# Altium footprint library ICs And Semiconductors SMD.PcbLib: 943 footprints (part 43 of 60)
Each footprint in its own frame and in the unit in brackets; x right, y up, seen from the top. Pads: shape width x height; smd on the part's side, far side on the other; paste and mask are expansions set on the pad; w line width, h text height; cw(c..) or ccw(c..) is an arc to the next point about the centre after c.
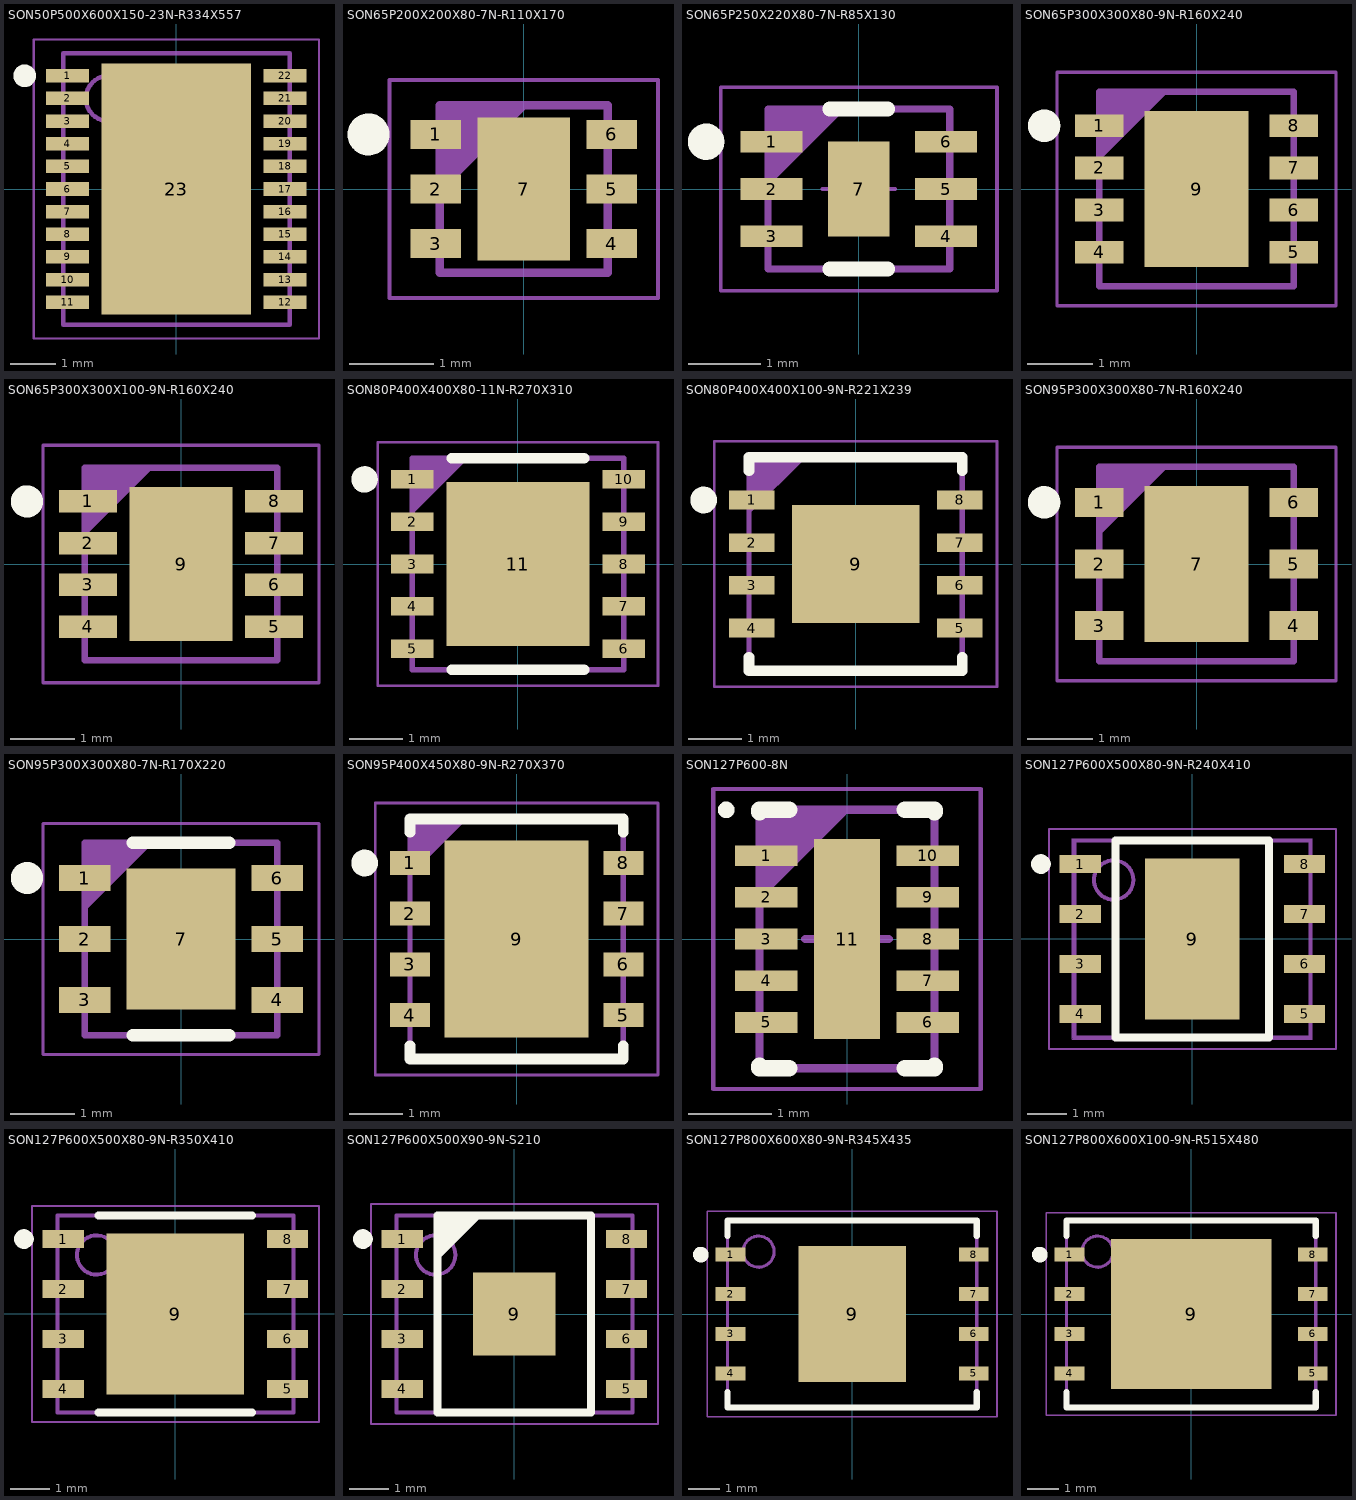
[diagram p42: the footprints below, top view; thin cyan lines are the x and y axes]

## SON50P500X600X150-23N-R334X557 [mm] "SON, 0.50mm Pitch; 22 Pin, 5.00mm W X 6.00mm L X 1.50mm H Body (w/Thermal Tab 3.34 X 5.57mm), IPC Medium Density"
height 1.5
pads (23):
  rect 0.95x0.3 smd: 1(-2.4,2.5) 2(-2.4,2) 3(-2.4,1.5) 4(-2.4,1) 5(-2.4,0.5) 6(-2.4,0) 7(-2.4,-0.5) 8(-2.4,-1) 9(-2.4,-1.5) 10(-2.4,-2) 11(-2.4,-2.5) 12(2.4,-2.5) 13(2.4,-2) 14(2.4,-1.5) 15(2.4,-1) 16(2.4,-0.5) 17(2.4,0) 18(2.4,0.5) 19(2.4,1) 20(2.4,1.5) 21(2.4,2) 22(2.4,2.5)
  rect 3.3x5.55 smd: 23(0,0)
Top Overlay:
  circle w0.25: c-3.35,2.5 r0.125
Top Paste:
  region: -0.9,-2.27 0.9,-2.27 0.9,-0.25 -0.9,-0.25
  region: -0.9,0.25 0.9,0.25 0.9,2.27 -0.9,2.27
Top Solder:
  circle w0.05: c0,0 r0.35
  lines w0.05: -0.5,0 0.5,0 ; 0,-0.5 0,0.5
Mechanical 14:
  circle w0.1: c-1.5,2 r0.5
  lines w0.1: -2.5,-3 2.5,-3 2.5,3 -2.5,3 -2.5,-3
Mechanical 15:
  lines w0.05: -3.15,-3.3 3.15,-3.3 3.15,3.3 -3.15,3.3 -3.15,-3.3
3D body "SON50P500X600X150-23N-R334X557.stp": height 1.5, standoff 0, extent -2.5,-3 2.5,3

## SON65P200X200X80-7N-R110X170 [mm] "SON, 0.65mm, Pitch; 6 Pin,2.00mm W X 2.00mm L X 0.80mm H body (W/Thermal Tab 1.1mm X 1.7mm),  IPC Medium Density"
height 0.8
pads (7):
  rect 0.6x0.35 smd: 1(-1.05,0.65) 2(-1.05,0) 3(-1.05,-0.65) 4(1.05,-0.65) 5(1.05,0) 6(1.05,0.65)
  rect 1.1x1.7 smd: 7(0,0)
Top Overlay:
  circle w0.25: c-1.85,0.65 r0.125
Top Paste:
  region: -0.308,0.608 0.307,0.608 0.307,-0.607 -0.308,-0.607
Mechanical 14:
  lines w0.1: -1,0 0,1 ; -1,0.1 -0.1,1 ; -1,0.2 -0.2,1 ; -1,0.3 -0.3,1 ; -1,0.4 -0.4,1 ; -1,0.5 -0.5,1 ; -1,0.6 -0.6,1 ; -1,0.7 -0.7,1 ; -1,0.8 -0.8,1 ; -1,0.9 -0.9,1 ; -1,-1 -1,1 1,1 1,-1 -1,-1
Mechanical 15:
  circle w0.05: c0,0 r0.35
  lines w0.05: -0.5,0 0.5,0 ; 0,-0.5 0,0.5 ; -1.6,-1.3 1.6,-1.3 1.6,1.3 -1.6,1.3 -1.6,-1.3
3D body "SON65P200X200X80-7N-R110X170.stp": height 0.77, standoff 0, extent -1.05,-1.05 1.05,1.05

## SON65P250X220X80-7N-R85X130 [mm] "SON, 0.65mm, Pitch; 6 Pin, 2.50mm W X 2.20mm L X 0.80mm H Body (W/Thermal Tab 0.75 X 1.2mm) (w/pullback leads),  IPC Medium Density"
height 0.8
pads (7):
  rect 0.85x0.3 smd: 1(-1.2,0.65) 2(-1.2,0) 3(-1.2,-0.65) 4(1.2,-0.65) 5(1.2,0) 6(1.2,0.65)
  rect 0.85x1.3 smd: 7(0,0)
Top Overlay:
  circle w0.25: c-2.1,0.65 r0.125
  lines w0.2: -0.4,-1.1 0.4,-1.1 ; -0.4,1.1 0.4,1.1
Mechanical 14:
  lines w0.1: -1.25,0.1 -0.25,1.1 ; -1.25,0.2 -0.35,1.1 ; -1.25,0.3 -0.45,1.1 ; -1.25,0.4 -0.55,1.1 ; -1.25,0.5 -0.65,1.1 ; -1.25,0.6 -0.75,1.1 ; -1.25,0.7 -0.85,1.1 ; -1.25,0.8 -0.95,1.1 ; -1.25,0.9 -1.05,1.1 ; -1.25,1 -1.15,1.1 ; -1.25,-1.1 -1.25,1.1 1.25,1.1 1.25,-1.1 -1.25,-1.1
Mechanical 15:
  circle w0.05: c0,0 r0.35
  lines w0.05: -0.5,0 0.5,0 ; 0,-0.5 0,0.5 ; -1.9,-1.4 -1.9,1.4 1.9,1.4 1.9,-1.4 -1.9,-1.4
3D body "SON65P250X220X80-7N-R85X130.stp": height 0.8, standoff 0, extent -1.3,-1.15 1.3,1.15

## SON65P300X300X80-9N-R160X240 [mm] "SON, 0.65mm pitch, 8 pin, 3mm X 3mm X 0.80mm H body (w/thermal tab 1.60 X 2.4mm),  IPC Medium Density"
height 0.8
pads (9):
  rect 0.75x0.35 smd: 1(-1.5,0.975) 2(-1.5,0.325) 3(-1.5,-0.325) 4(-1.5,-0.975) 5(1.5,-0.975) 6(1.5,-0.325) 7(1.5,0.325) 8(1.5,0.975)
  rect 1.6x2.4 smd paste-0.35: 9(0,0)
Top Overlay:
  circle w0.25: c-2.35,0.975 r0.125
Mechanical 14:
  lines w0.1: -1.5,0.5 -0.5,1.5 ; -1.5,0.6 -0.6,1.5 ; -1.5,0.7 -0.7,1.5 ; -1.5,0.8 -0.8,1.5 ; -1.5,0.9 -0.9,1.5 ; -1.5,1 -1,1.5 ; -1.5,1.1 -1.1,1.5 ; -1.5,1.2 -1.2,1.5 ; -1.5,1.3 -1.3,1.5 ; -1.5,1.4 -1.4,1.5 ; -1.5,-1.5 -1.5,1.5 1.5,1.5 1.5,-1.5 -1.5,-1.5
Mechanical 15:
  circle w0.05: c0,0 r0.35
  lines w0.05: -0.5,0 0.5,0 ; 0,-0.5 0,0.5 ; -2.15,-1.8 2.15,-1.8 2.15,1.8 -2.15,1.8 -2.15,-1.8
3D body "SON65P300X300X80-9N-R160X240.stp": height 0.8, standoff 0, extent -1.5,-1.5 1.5,1.5

## SON65P300X300X100-9N-R160X240 [mm] "SON, 0.65mm pitch, 8 pin, 3mm X 3mm X 1.00mm H body (w/thermal tab 1.60 X 2.4mm),  IPC Medium Density"
height 1
pads (9):
  rect 0.9x0.35 smd: 1(-1.45,0.975) 2(-1.45,0.325) 3(-1.45,-0.325) 4(-1.45,-0.975) 5(1.45,-0.975) 6(1.45,-0.325) 7(1.45,0.325) 8(1.45,0.975)
  rect 1.6x2.4 smd: 9(0,0)
Top Overlay:
  circle w0.25: c-2.4,0.975 r0.125
Mechanical 14:
  lines w0.1: -1.5,0.5 -0.5,1.5 ; -1.5,0.6 -0.6,1.5 ; -1.5,0.7 -0.7,1.5 ; -1.5,0.8 -0.8,1.5 ; -1.5,0.9 -0.9,1.5 ; -1.5,1 -1,1.5 ; -1.5,1.1 -1.1,1.5 ; -1.5,1.2 -1.2,1.5 ; -1.5,1.3 -1.3,1.5 ; -1.5,1.4 -1.4,1.5 ; -1.5,-1.5 -1.5,1.5 1.5,1.5 1.5,-1.5 -1.5,-1.5
Mechanical 15:
  circle w0.05: c0,0 r0.35
  lines w0.05: -0.5,0 0.5,0 ; 0,-0.5 0,0.5 ; -2.15,-1.85 2.15,-1.85 2.15,1.85 -2.15,1.85 -2.15,-1.85
3D body "SON65P300X300X100-9N-R160X240.stp": height 1, standoff 0, extent -1.5,-1.5 1.5,1.5

## SON80P400X400X80-11N-R270X310 [mm] "SON, 0.80mm Pitch, 10 Pin, 4mm X 4mm X 0.80mm H Body (w/Thermal Tab 2.70 X 3.10mm),  IPC Medium Density"
height 0.8
pads (11):
  rect 0.8x0.35 smd: 1(-2,1.6) 2(-2,0.8) 3(-2,0) 4(-2,-0.8) 5(-2,-1.6) 6(2,-1.6) 7(2,-0.8) 8(2,0) 9(2,0.8) 10(2,1.6)
  rect 2.7x3.1 smd paste-0.53: 11(0,0)
Top Overlay:
  circle w0.25: c-2.9,1.6 r0.125
  lines w0.2: -1.25,-2 1.25,-2 ; -1.25,2 1.25,2
Mechanical 14:
  lines w0.1: -2,1 -1,2 ; -2,1.1 -1.1,2 ; -2,1.2 -1.2,2 ; -2,1.3 -1.3,2 ; -2,1.4 -1.4,2 ; -2,1.5 -1.5,2 ; -2,1.6 -1.6,2 ; -2,1.7 -1.7,2 ; -2,1.8 -1.8,2 ; -2,1.9 -1.9,2 ; -2,-2 -2,2 2,2 2,-2 -2,-2
Mechanical 15:
  circle w0.05: c0,0 r0.35
  lines w0.05: -0.5,0 0.5,0 ; 0,-0.5 0,0.5 ; -2.65,-2.3 2.65,-2.3 2.65,2.3 -2.65,2.3 -2.65,-2.3
3D body "SON80P400X400X80-11N-R270X310.stp": height 0.8, standoff 0, extent -2.05,-2.05 2.05,2.05

## SON80P400X400X100-9N-R221X239 [mm] "SON, 0.80mm Pitch, 8 Pin, 4mm X 4mm X 1.00mm H Body (w/Thermal Tab 2.21 X 2.39mm),  IPC Medium Density"
height 1
pads (9):
  rect 0.85x0.35 smd: 1(-1.95,1.2) 2(-1.95,0.4) 3(-1.95,-0.4) 4(-1.95,-1.2) 5(1.95,-1.2) 6(1.95,-0.4) 7(1.95,0.4) 8(1.95,1.2)
  rect 2.39x2.21 smd: 9(0,0)
Top Overlay:
  circle w0.25: c-2.85,1.2 r0.125
  lines w0.2: -2,-1.75 -2,-2 2,-2 2,-1.75 ; -2,1.75 -2,2 2,2 2,1.75
Mechanical 14:
  lines w0.1: -2,1 -1,2 ; -2,1.1 -1.1,2 ; -2,1.2 -1.2,2 ; -2,1.3 -1.3,2 ; -2,1.4 -1.4,2 ; -2,1.5 -1.5,2 ; -2,1.6 -1.6,2 ; -2,1.7 -1.7,2 ; -2,1.8 -1.8,2 ; -2,1.9 -1.9,2 ; -2,-2 -2,2 2,2 2,-2 -2,-2
Mechanical 15:
  circle w0.05: c0,0 r0.35
  lines w0.05: -0.5,0 0.5,0 ; 0,-0.5 0,0.5 ; -2.65,-2.3 2.65,-2.3 2.65,2.3 -2.65,2.3 -2.65,-2.3
3D body "SON80P400X400X100-9N-R221X239.stp": height 1, standoff 0, extent -2,-2 2,2

## SON95P300X300X80-7N-R160X240 [mm] "SON, 0.95mm Pitch; 6 Pin, 3.00mm W X 3mm L X 0.80mm H body (w/Thermal Tab 1.6mm x 2.4mm)"
height 0.8
pads (7):
  rect 0.75x0.45 smd: 1(-1.5,0.95) 2(-1.5,0) 3(-1.5,-0.95) 4(1.5,-0.95) 5(1.5,0) 6(1.5,0.95)
  rect 1.6x2.4 smd: 7(0,0)
Top Overlay:
  circle w0.25: c-2.35,0.95 r0.125
Mechanical 14:
  lines w0.1: -1.5,0.5 -0.5,1.5 ; -1.5,0.6 -0.6,1.5 ; -1.5,0.7 -0.7,1.5 ; -1.5,0.8 -0.8,1.5 ; -1.5,0.9 -0.9,1.5 ; -1.5,1 -1,1.5 ; -1.5,1.1 -1.1,1.5 ; -1.5,1.2 -1.2,1.5 ; -1.5,1.3 -1.3,1.5 ; -1.5,1.4 -1.4,1.5 ; -1.5,-1.5 -1.5,1.5 1.5,1.5 1.5,-1.5 -1.5,-1.5
Mechanical 15:
  circle w0.05: c0,0 r0.35
  lines w0.05: -0.5,0 0.5,0 ; 0,-0.5 0,0.5 ; -2.15,-1.8 2.15,-1.8 2.15,1.8 -2.15,1.8 -2.15,-1.8
3D body "SON95P300X300X80-7N-R160X240.stp": height 0.8, standoff 0, extent -1.55,-1.55 1.55,1.55

## SON95P300X300X80-7N-R170X220 [mm] "SON, 0.95mm Pitch; 6 Pin, 3.00mm W X 3mm L X 0.80mm H body (w/Thermal Tab 1.7mm x 2.2mm)"
height 0.8
pads (7):
  rect 0.8x0.4 smd: 1(-1.5,0.95) 2(-1.5,0) 3(-1.5,-0.95) 4(1.5,-0.95) 5(1.5,0) 6(1.5,0.95)
  rect 1.7x2.2 smd: 7(0,0)
Top Overlay:
  circle w0.25: c-2.4,0.95 r0.125
  lines w0.2: -0.75,-1.5 0.75,-1.5 ; -0.75,1.5 0.75,1.5
Mechanical 14:
  lines w0.1: -1.5,0.5 -0.5,1.5 ; -1.5,0.6 -0.6,1.5 ; -1.5,0.7 -0.7,1.5 ; -1.5,0.8 -0.8,1.5 ; -1.5,0.9 -0.9,1.5 ; -1.5,1 -1,1.5 ; -1.5,1.1 -1.1,1.5 ; -1.5,1.2 -1.2,1.5 ; -1.5,1.3 -1.3,1.5 ; -1.5,1.4 -1.4,1.5 ; -1.5,-1.5 1.5,-1.5 1.5,1.5 -1.5,1.5 -1.5,-1.5
Mechanical 15:
  circle w0.05: c0,0 r0.35
  lines w0.05: -0.5,0 0.5,0 ; 0,-0.5 0,0.5 ; -2.15,-1.8 -2.15,1.8 2.15,1.8 2.15,-1.8 -2.15,-1.8
3D body "SON95P300X300X80-7N-R170X220.stp": height 0.8, standoff 0, extent -1.55,-1.55 1.55,1.55

## SON95P400X450X80-9N-R270X370 [mm] "SON, 0.95mm Pitch; 8 Pin, 4.00mm W X 4.50mm L X 0.80mm H body (w/Thermal Tab 2.7mm x 3.7mm)"
height 0.8
pads (9):
  rect 0.75x0.45 smd: 1(-2,1.425) 2(-2,0.475) 3(-2,-0.475) 4(-2,-1.425) 5(2,-1.425) 6(2,-0.475) 7(2,0.475) 8(2,1.425)
  rect 2.7x3.7 smd paste-0.57: 9(0,0)
Top Overlay:
  circle w0.25: c-2.85,1.425 r0.125
  lines w0.2: -2,-2 -2,-2.25 2,-2.25 2,-2 ; -2,2 -2,2.25 2,2.25 2,2
Mechanical 14:
  lines w0.1: -2,1.25 -1,2.25 ; -2,1.35 -1.1,2.25 ; -2,1.45 -1.2,2.25 ; -2,1.55 -1.3,2.25 ; -2,1.65 -1.4,2.25 ; -2,1.75 -1.5,2.25 ; -2,1.85 -1.6,2.25 ; -2,1.95 -1.7,2.25 ; -2,2.05 -1.8,2.25 ; -2,2.15 -1.9,2.25 ; -2,-2.25 2,-2.25 2,2.25 -2,2.25 -2,-2.25
Mechanical 15:
  circle w0.05: c0,0 r0.35
  lines w0.05: -0.5,0 0.5,0 ; 0,-0.5 0,0.5 ; -2.65,-2.55 2.65,-2.55 2.65,2.55 -2.65,2.55 -2.65,-2.55
3D body "SON95P400X450X80-9N-R270X370.stp": height 0.8, standoff 0, extent -2.05,-2.3 2.05,2.3

## SON127P600-8N [mm]
height 0.8
pads (11):
  rect 0.75x0.25 smd: 1(-0.97,1) 2(-0.97,0.5) 3(-0.97,0) 4(-0.97,-0.5) 5(-0.97,-1) 6(0.97,-1) 7(0.97,-0.5) 8(0.97,0) 9(0.97,0.5) 10(0.97,1)
  rect 0.79x2.4 smd paste-0.395: 11(0,0)
Top Overlay:
  circle w0.1: c-1.45,1.55 r0.05
  lines w0.2: -1.05,-1.525 -1.05,-1.55 -0.695,-1.55 ; -1.05,1.525 -1.05,1.55 -0.695,1.55 ; 0.695,-1.55 1.05,-1.55 1.05,-1.525 ; 0.695,1.55 1.05,1.55 1.05,1.525
Top Paste:
  rectangle: -0.42,-1.2 0.42,1.2
Mechanical 14:
  lines w0.1: -1.05,0.525 -0.05,1.525 ; -1.05,0.625 -0.15,1.525 ; -1.05,0.725 -0.25,1.525 ; -1.05,0.825 -0.35,1.525 ; -1.05,0.925 -0.45,1.525 ; -1.05,1.025 -0.55,1.525 ; -1.05,1.125 -0.65,1.525 ; -1.05,1.225 -0.75,1.525 ; -1.05,1.325 -0.85,1.525 ; -1.05,1.425 -0.95,1.525 ; -1.05,-1.55 -1.05,1.55 1.05,1.55 1.05,-1.55 -1.05,-1.55
Mechanical 15:
  lines w0.05: -1.605,-1.8 -1.605,1.8 1.605,1.8 1.605,-1.8 -1.605,-1.8
  lines w0.1: -0.5,0 0.5,0 ; 0,-0.5 0,0.5
3D body: height 0.8, standoff 0, extent -1.05,-1.55 1.05,1.55

## SON127P600X500X80-9N-R240X410 [mm] "SON, 1.27mm pitch, 8 pin, 6.00mm W X 5.00mm L X 0.80mm H body (w/thermal tab  2.40 X 4.10 mm), IPC Medium Density"
height 0.8
pads (9):
  rect 1.05x0.45 smd: 1(-2.85,1.905) 2(-2.85,0.635) 3(-2.85,-0.635) 4(-2.85,-1.905) 5(2.85,-1.905) 6(2.85,-0.635) 7(2.85,0.635) 8(2.85,1.905)
  rect 2.4x4.1 smd: 9(0,0)
Top Overlay:
  circle w0.25: c-3.85,1.905 r0.125
  lines w0.2: -1.95,-2.5 1.95,-2.5 1.95,2.5 -1.95,2.5 -1.95,-2.5
Mechanical 8:
  lines w0.001: -3.05,-2.55 3.05,-2.55 3.05,2.55 -3.05,2.55 -3.05,-2.55
Mechanical 14:
  circle w0.1: c-2,1.5 r0.5
  lines w0.1: -3,-2.5 3,-2.5 3,2.5 -3,2.5 -3,-2.5
Mechanical 15:
  circle w0.05: c0,0 r0.35
  lines w0.05: -0.5,0 0.5,0 ; 0,-0.5 0,0.5 ; -3.65,-2.8 3.65,-2.8 3.65,2.8 -3.65,2.8 -3.65,-2.8
3D body "SON127P600X500X80-9N-R240X410.stp": height 0.8, standoff 0, extent -3,-2.5 3,2.5

## SON127P600X500X80-9N-R350X410 [mm] "SON, 1.27mm pitch, 8 pin, 6.00mm W X 5.00mm L X 0.80mm H body (w/thermal tab  3.50 X 4.10 mm), IPC Medium Density"
height 0.8
pads (9):
  rect 1.05x0.45 smd: 1(-2.85,1.905) 2(-2.85,0.635) 3(-2.85,-0.635) 4(-2.85,-1.905) 5(2.85,-1.905) 6(2.85,-0.635) 7(2.85,0.635) 8(2.85,1.905)
  rect 3.5x4.1 smd: 9(0,0)
Top Overlay:
  circle w0.25: c-3.85,1.905 r0.125
  lines w0.2: -1.95,-2.5 1.95,-2.5 ; -1.95,2.5 1.95,2.5
Mechanical 14:
  circle w0.1: c-2,1.5 r0.5
  lines w0.1: -3,-2.5 3,-2.5 3,2.5 -3,2.5 -3,-2.5
Mechanical 15:
  circle w0.05: c0,0 r0.35
  lines w0.05: -0.5,0 0.5,0 ; 0,-0.5 0,0.5 ; -3.65,-2.75 3.65,-2.75 3.65,2.75 -3.65,2.75 -3.65,-2.75
3D body "SON127P600X500X80-9N-R350X410.stp": height 0.8, standoff 0, extent -3,-2.5 3,2.5

## SON127P600X500X90-9N-S210 [mm] "SON, 1.27mm Pitch; 8 Pin, 6.00mm W X 5.00mm L X 0.90mm H Body (w/Thermal Tab 2.1mm x 2.1mm)"
height 0.9
pads (9):
  rect 1.05x0.45 smd: 1(-2.85,1.905) 2(-2.85,0.635) 3(-2.85,-0.635) 4(-2.85,-1.905) 5(2.85,-1.905) 6(2.85,-0.635) 7(2.85,0.635) 8(2.85,1.905)
  rect 2.1x2.1 smd paste-0.385: 9(0,0)
Top Overlay:
  circle w0.25: c-3.85,1.905 r0.125
  lines w0.2: -1.95,1.5 -0.95,2.5 ; -1.95,1.7 -1.15,2.5 ; -1.95,1.9 -1.35,2.5 ; -1.95,2.1 -1.55,2.5 ; -1.95,2.3 -1.75,2.5 ; -1.95,-2.5 -1.95,2.5 1.95,2.5 1.95,-2.5 -1.95,-2.5
Mechanical 14:
  circle w0.1: c-2,1.5 r0.5
  lines w0.1: -3,-2.5 -3,2.5 3,2.5 3,-2.5 -3,-2.5
Mechanical 15:
  circle w0.05: c0,0 r0.35
  lines w0.05: -0.5,0 0.5,0 ; 0,-0.5 0,0.5 ; -3.65,-2.8 -3.65,2.8 3.65,2.8 3.65,-2.8 -3.65,-2.8
3D body "SON127P600X500X90-9N-S210.stp": height 0.9, standoff 0, extent -3,-2.5 3,2.5

## SON127P800X600X80-9N-R345X435 [mm] "SON, 1.27mm Pitch; 8 Pin, 6.00mm W X 8.00mm L X 0.8mm H body (w/Thermal Tab 3.45mm x 4.35mm)"
height 0.8
pads (9):
  rect 0.95x0.45 smd: 1(-3.9,1.905) 2(-3.9,0.635) 3(-3.9,-0.635) 4(-3.9,-1.905) 5(3.9,-1.905) 6(3.9,-0.635) 7(3.9,0.635) 8(3.9,1.905)
  rect 3.45x4.35 smd: 9(0,0)
Top Overlay:
  circle w0.25: c-4.85,1.905 r0.125
  lines w0.2: -4,-2.5 -4,-3 4,-3 4,-2.5 ; -4,2.5 -4,3 4,3 4,2.5
Mechanical 14:
  circle w0.1: c-3,2 r0.5
  lines w0.1: -4,-3 -4,3 4,3 4,-3 -4,-3
Mechanical 15:
  circle w0.05: c0,0 r0.35
  lines w0.05: -0.5,0 0.5,0 ; 0,-0.5 0,0.5 ; -4.65,-3.3 -4.65,3.3 4.65,3.3 4.65,-3.3 -4.65,-3.3
3D body "SON127P800X600X80-9N-R345X435.stp": height 0.8, standoff 0, extent -4,-3 4,3

## SON127P800X600X100-9N-R515X480 [mm] "SON, 1.27mm Pitch; 8 Pin, 6.00mm W X 8.00mm L X 1mm H body (w/Thermal Tab 5.15mm x 4.8mm)"
height 1
pads (9):
  rect 0.95x0.45 smd: 1(-3.9,1.905) 2(-3.9,0.635) 3(-3.9,-0.635) 4(-3.9,-1.905) 5(3.9,-1.905) 6(3.9,-0.635) 7(3.9,0.635) 8(3.9,1.905)
  rect 5.15x4.8 smd: 9(0,0)
Top Overlay:
  circle w0.25: c-4.85,1.905 r0.125
  lines w0.2: -4,-2.5 -4,-3 4,-3 4,-2.5 ; -4,2.5 -4,3 4,3 4,2.5
Top Paste:
  region: -1.96,-1.49 -0.3,-1.49 -0.3,1.49 -1.96,1.49
  region: 0.3,-1.49 1.96,-1.49 1.96,1.49 0.3,1.49
Mechanical 14:
  circle w0.1: c-3,2 r0.5
  lines w0.1: -4,-3 4,-3 4,3 -4,3 -4,-3
Mechanical 15:
  circle w0.05: c0,0 r0.35
  lines w0.05: -0.5,0 0.5,0 ; 0,-0.5 0,0.5 ; -4.65,-3.25 4.65,-3.25 4.65,3.25 -4.65,3.25 -4.65,-3.25
3D body "SON127P800X600X100-9N-R515X480.stp": height 1, standoff 0, extent -4,-3 4,3